# Altium footprint library ThanhNT.PcbLib: 579 footprints (part 4 of 37)
Each footprint in its own frame and in the unit in brackets; x right, y up, seen from the top. Pads: shape width x height; smd on the part's side, far side on the other; paste and mask are expansions set on the pad; w line width, h text height; cw(c..) or ccw(c..) is an arc to the next point about the centre after c.
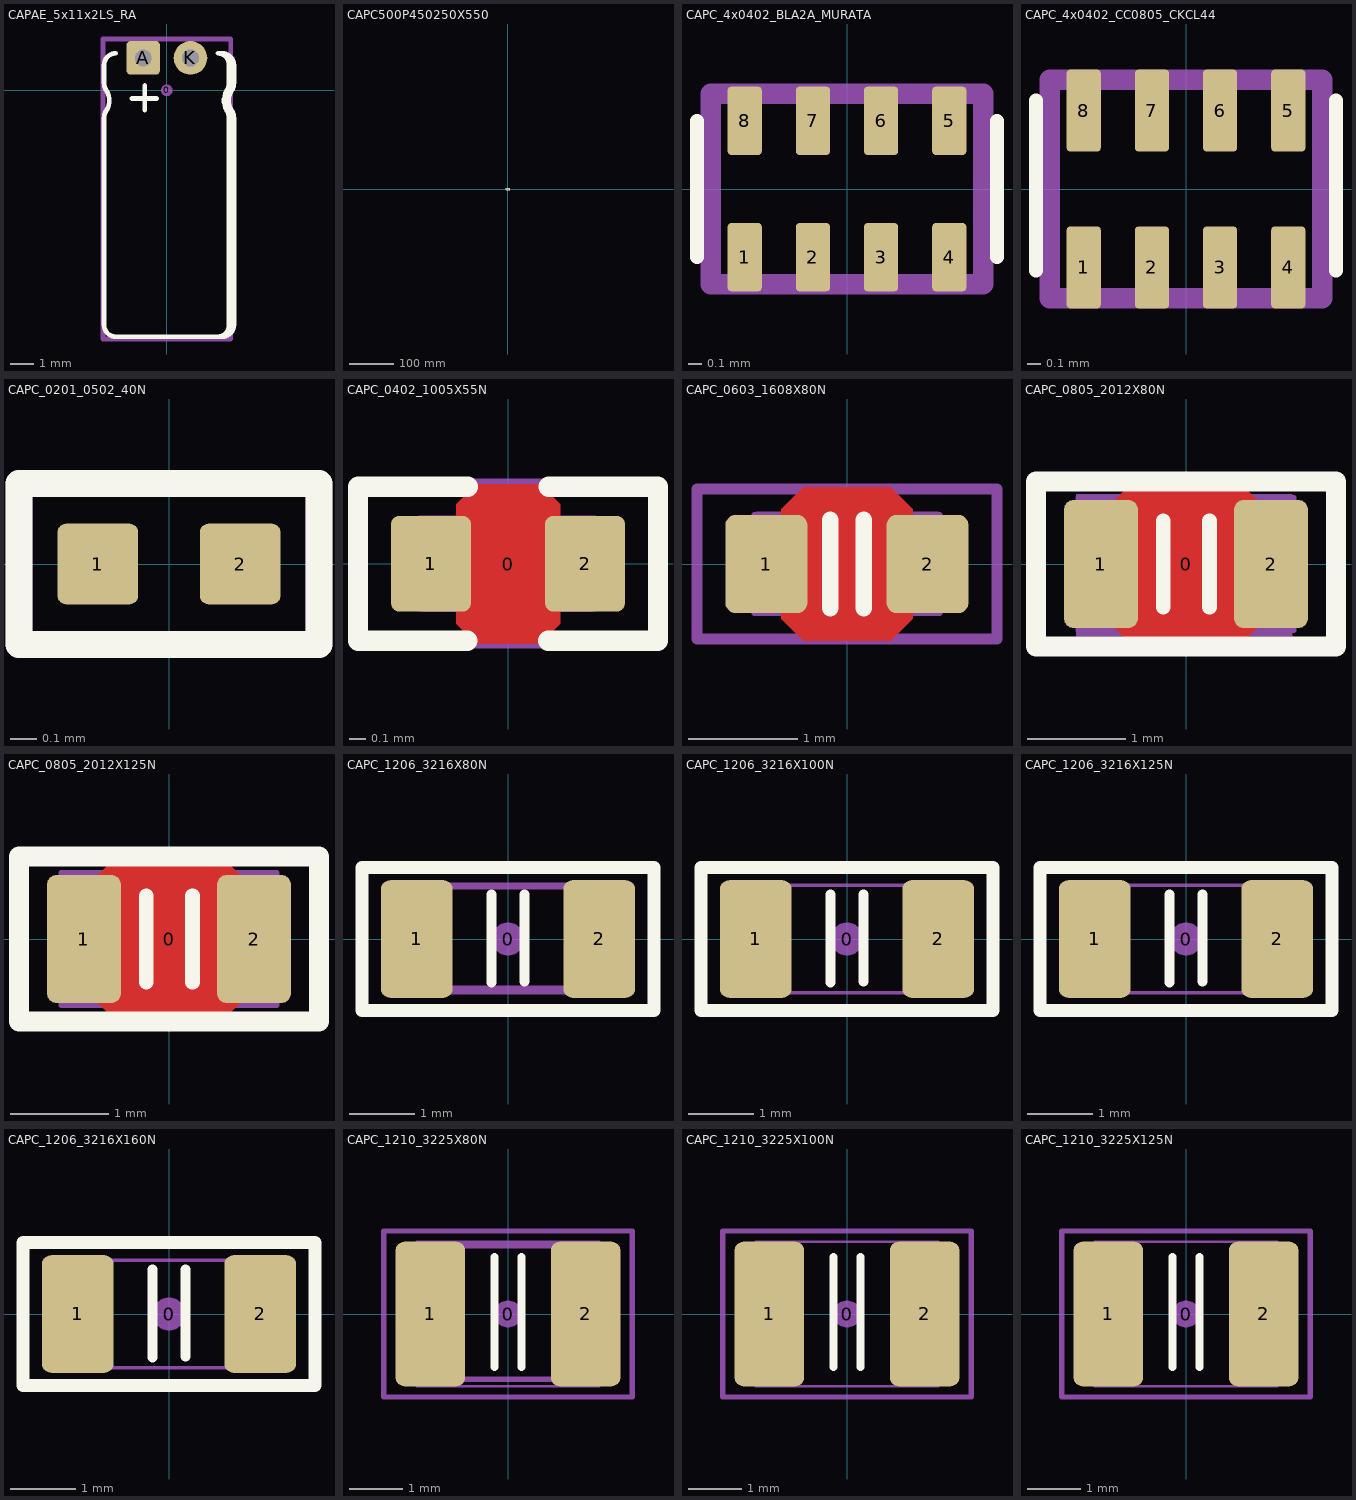
[diagram p3: the footprints below, top view; thin cyan lines are the x and y axes]

## CAPAE_5x11x2LS_RA [mm] "Capacitor, electrolytic, radial can, laid over"
height 5
pads (3):
  round 0.5 on Mech15: 0(0,0)
  rrect25% 1.422x1.422 hole 0.711: A(-1,1.375)
  round 1.422 hole 0.711: K(1,1.375)
Top Overlay:
  lines w0.2: -2.159,1.571 ccw(c-2.159,1.07) -2.66,1.07 -2.66,0.299 ccw(c-2.159,0.299) -2.571,0.013 cw(c-3.209,-0.43) -2.571,-0.872 ccw(c-2.159,-1.158) -2.66,-1.158 -2.66,-9.93 ccw(c-2.159,-9.93) -2.159,-10.431 2.17,-10.431 ccw(c2.15,-9.948) 2.633,-9.93 2.633,-1.158 ccw(c2.103,-1.156) 2.55,-0.872 cw(c3.249,-0.43) 2.55,0.013 ccw(c2.103,0.297) 2.633,0.299 2.633,1.07 ccw(c2.15,1.089) 2.17,1.571 ; -1.485,-0.346 -0.435,-0.346 ; -0.935,-0.846 -0.935,0.204 ; 2.199,-10.43 2.341,-10.43 ccw(c2.341,-9.93) 2.841,-9.93 2.841,-1.158 ccw(c2.341,-1.158) 2.752,-0.873 cw(c3.391,-0.43) 2.752,0.014 ccw(c2.341,0.299) 2.841,0.299 2.841,1.07 ccw(c2.341,1.07) 2.341,1.57 2.199,1.57
Mechanical 15:
  lines w0.2: -2.7,-10.525 2.7,-10.525 2.7,2.175 -2.7,2.175 -2.7,-10.525
3D body "Cap, elec, radial, 5x11x2LS, RA.STEP": height 5.1, standoff -2.2, extent -2.5,-10.322 2.5,1.625

## CAPC500P450250X550 [mm] "TDK FK24 radial ceramic capacitor"
height 5.5
pads (3):
  round 0.508 on Mech15: 0(0,0)
  rrect25% 1.905x1.905 hole 0.8: 1(-2.5,0)
  round 1.905 hole 0.8: 2(2.5,0)
Top Overlay:
  lines w0.2: -3.81,-1.27 -3.81,1.27 3.81,1.27 3.81,-1.27 -3.81,-1.27
Mechanical 13:
  lines w0.127: -2.5,-0.3 cw(c-2.5,0) -2.5,0.3 ; -2.25,-0.523 -2.248,-0.511 -2.24,-0.497 -2.227,-0.48 -2.21,-0.461 -2.186,-0.439 -2.157,-0.415 -2.122,-0.387 -2.083,-0.357 -2.046,-0.327 -2.006,-0.292 -1.995,-0.281 -1.983,-0.268 -1.972,-0.254 -1.962,-0.238 -1.958,-0.229 -1.955,-0.218 -1.954,-0.211 -1.953,-0.203 ; -2.25,0.523 cw(c-3.279,-0.727) -1.953,0.203 ; -2.236,-0.718 cw(c-1.896,-0.22) -2.5,-0.217 -2.5,0.217 cw(c-1.896,0.221) -2.232,0.723 -2.23,0.724 -2.206,0.741 ; -2.232,-0.723 -2.225,-0.727 -2.205,-0.742 ; 2.205,0.742 2.225,0.727 2.232,0.723 ; 2.206,-0.741 2.23,-0.724 2.232,-0.723 ccw(c1.896,-0.221) 2.5,-0.217 2.5,0.217 ccw(c1.896,0.22) 2.236,0.718 ; 2.25,-0.523 2.243,-0.502 2.225,-0.477 2.187,-0.44 2.134,-0.397 2.073,-0.349 2.007,-0.293 1.986,-0.271 1.967,-0.246 1.956,-0.223 1.953,-0.203 ; 2.25,0.523 2.24,0.497 2.21,0.461 2.157,0.415 2.083,0.357 2.046,0.327 2.006,0.292 1.983,0.268 1.962,0.238 1.955,0.218 1.953,0.203 ; 2.5,-0.3 ccw(c2.5,0) 2.5,0.3 ; -1.953,-0.203 1.953,-0.203 ; -1.953,-0.203 -1.953,0.203 ; -1.953,0.203 1.953,0.203 ; -1.8,-1.003 cw(c-1.777,-0.913) -1.867,-0.935 cw(c9.111,-1.292) -1.819,-0.203 -1.819,0.203 ccw(c-168.083,-10.401) -1.867,0.935 cw(c-1.777,0.912) -1.8,1.003 ; -1.8,-1.003 cw(c-1.8,-0.553) -2.25,-0.553 -2.25,0.553 cw(c-1.8,0.553) -1.8,1.003 ; -1.8,-1.003 1.8,-1.003 ; -1.8,1.003 1.8,1.003 ; 1.8,-1.003 ccw(c1.777,-0.912) 1.867,-0.935 cw(c168.269,10.414) 1.819,-0.203 1.819,0.203 ccw(c-9.111,1.292) 1.867,0.935 ccw(c1.777,0.913) 1.8,1.003 ; 1.8,-1.003 ccw(c1.8,-0.553) 2.25,-0.553 2.25,0.553 ccw(c1.8,0.553) 1.8,1.003 ; 1.953,-0.203 1.953,0.203
3D body "TDK FK24 ceramic capacitor.STEP": height 5.47, standoff -2.54, extent -2.797,-1.003 2.798,1.003

## CAPC_4x0402_BLA2A_MURATA [mm]
pads (8):
  rrect20% 0.25x0.5 smd mask+0.025: 1(-0.75,-0.5) 2(-0.25,-0.5) 3(0.25,-0.5) 4(0.75,-0.5) 5(0.75,0.5) 6(0.25,0.5) 7(-0.25,0.5) 8(-0.75,0.5)
Top Overlay:
  lines w0.1: -1.1,-0.5 -1.1,0.5 ; 1.1,-0.5 1.1,0.5
Mechanical 16:
  lines w0.15: -1,-0.7 1,-0.7 1,0.7 -1,0.7 -1,-0.7
3D body: height 0.5, standoff 0, extent -1,-0.5 1,0.5

## CAPC_4x0402_CC0805_CKCL44 [mm]
pads (8):
  rrect20% 0.25x0.6 smd mask+0.025: 1(-0.75,-0.575) 2(-0.25,-0.575) 3(0.25,-0.575) 4(0.75,-0.575) 5(0.75,0.575) 6(0.25,0.575) 7(-0.25,0.575) 8(-0.75,0.575)
Top Overlay:
  lines w0.1: -1.1,-0.6 -1.1,0.65 ; 1.1,-0.6 1.1,0.65
Mechanical 16:
  lines w0.15: -1,-0.8 1,-0.8 1,0.8 -1,0.8 -1,-0.8
3D body: height 1, standoff 0, extent -1,-0.7 1,0.7

## CAPC_0201_0502_40N [mm]
pads (2):
  rrect20% 0.3x0.3 smd mask+0.04: 1(-0.265,0) 2(0.265,0)
Top Overlay:
  lines w0.1: -0.559,-0.3 0.559,-0.3 0.559,0.3 -0.559,0.3 -0.559,-0.3
Mechanical 16:
  lines w0.1: -0.559,-0.3 0.559,-0.3 0.559,0.3 -0.559,0.3 -0.559,-0.3
3D body "C0201.step": height 0.3, standoff 0, extent -0.3,-0.15 0.3,0.15

## CAPC_0402_1005X55N [mm] "Chip Capacitor, Body 1.0x0.5mm, EIA 0402, IPC Medium Density"
height 0.55
pads (3):
  round 0.2 on Mech15: 0(0.001,-0.002)
  rrect20% 0.5x0.6 smd: 1(-0.483,0) 2(0.483,0)
Top Layer:
  pour cut-out: -0.324,0.373 -0.199,0.498 0.201,0.498 0.326,0.373 0.326,-0.377 0.201,-0.502 -0.199,-0.502 -0.324,-0.377
Top Overlay:
  lines w0.127: -0.254,-0.483 -0.94,-0.483 -0.94,0.483 -0.25,0.483 ; 0.25,-0.483 0.94,-0.483 0.94,0.483 0.254,0.483
Mechanical 13:
  lines w0.05: -0.324,-0.257 0.326,-0.257 ; -0.324,0.253 0.326,0.253 ; -0.524,-0.277 -0.324,-0.277 -0.324,0.273 -0.524,0.273 -0.524,-0.277 ; 0.326,-0.277 0.326,0.273 0.526,0.273 0.526,-0.277 0.326,-0.277
Mechanical 15:
  lines w0.1: -0.94,-0.483 -0.94,0.483 0.94,0.483 0.94,-0.483 -0.94,-0.483
Mechanical 16:
  rectangle: -0.56,-0.299 -0.26,0.301
  rectangle: 0.253,-0.299 0.553,0.301
  lines w0.152: -0.251,-0.218 0.239,-0.218 ; -0.251,0.23 0.239,0.23
3D body "User Library-SMD CAPACITOR0402.STEP": height 0.5, standoff 0, extent -0.499,-0.252 0.501,0.248

## CAPC_0603_1608X80N [mm] "Chip Capacitor, Body 1.6x0.8mm, EIA 0603, IPC Medium Density"
height 0.8
pads (2):
  rrect25% 0.75x0.9 smd: 1(-0.737,0) 2(0.737,0)
Top Layer:
  pour cut-out: -0.6,0.5 -0.4,0.7 0.4,0.7 0.6,0.5 0.6,-0.5 0.4,-0.7 -0.4,-0.7 -0.6,-0.5
Top Overlay:
  lines w0.15: -0.152,-0.406 -0.152,0.406 ; 0.152,-0.406 0.152,0.406
Mechanical 13:
  lines w0.05: -0.55,-0.43 0.55,-0.43 ; -0.55,0.43 0.55,0.43 ; -0.85,-0.45 -0.85,0.45 -0.55,0.45 -0.55,-0.45 -0.85,-0.45 ; 0.55,-0.45 0.55,0.45 0.85,0.45 0.85,-0.45 0.55,-0.45
Mechanical 15:
  lines w0.1: -1.372,-0.686 -1.372,0.686 1.372,0.686 1.372,-0.686 -1.372,-0.686
Mechanical 16:
  rectangle: 0.336,-0.472 0.836,0.478
  rectangle: -0.832,-0.472 -0.332,0.478
  lines w0.102: -0.35,-0.421 0.362,-0.421 ; -0.35,0.43 0.362,0.43
3D body "C0603-0.80.step": height 0.81, standoff 0, extent -0.8,-0.41 0.8,0.41

## CAPC_0805_2012X80N [mm] "Chip Capacitor, Body 2.0x1.2mm, EIA 0805, IPC Medium Density"
height 0.8
pads (3):
  round 0.254 on Mech15: 0(0,0)
  rrect25% 0.75x1.3 smd: 1(-0.864,0) 2(0.864,0)
Top Layer:
  pour cut-out: -0.725,0.65 -0.525,0.85 0.525,0.85 0.725,0.65 0.725,-0.65 0.525,-0.85 -0.525,-0.85 -0.725,-0.65
Top Overlay:
  lines w0.15: -0.23,-0.44 -0.23,0.44 ; 0.24,-0.44 0.24,0.44
  lines w0.2: -1.524,-0.838 -1.524,0.838 1.524,0.838 1.524,-0.838 -1.524,-0.838
Mechanical 13:
  lines w0.05: 0.6,-0.674 -0.6,-0.674 ; -0.6,-0.675 -0.6,0.675 -1.1,0.675 -1.1,-0.675 -0.6,-0.675 ; -0.6,-0.674 0.6,-0.674 ; 0.6,-0.675 0.6,0.675 ; 0.6,-0.675 1.1,-0.675 1.1,0.675 0.6,0.675 ; 0.6,0.674 -0.6,0.674 0.6,0.674
Mechanical 15:
  lines w0.1: -1.524,-0.85 1.524,-0.85 1.524,0.85 -1.524,0.85 -1.524,-0.85
Mechanical 16:
  rectangle: -1.116,-0.739 -0.366,0.711
  rectangle: 0.332,-0.739 1.082,0.711
  lines w0.102: -0.405,0.645 0.357,0.645 ; -0.38,-0.675 0.357,-0.675
3D body "C0805-0.80.step": height 0.81, standoff 0, extent -0.9,-0.635 0.9,0.635

## CAPC_0805_2012X125N [mm] "Chip Capacitor, Body 2.0x1.2mm, EIA 0805, IPC Medium Density"
height 1.25
pads (3):
  round 0.254 on Mech15: 0(0,0)
  rrect25% 0.75x1.3 smd: 1(-0.864,0) 2(0.864,0)
Top Layer:
  pour cut-out: -0.725,0.65 -0.525,0.85 0.525,0.85 0.725,0.65 0.725,-0.65 0.525,-0.85 -0.525,-0.85 -0.725,-0.65
Top Overlay:
  lines w0.15: -0.23,-0.44 -0.23,0.44 ; 0.24,-0.44 0.24,0.44
  lines w0.2: -1.524,-0.838 1.524,-0.838 1.524,0.838 -1.524,0.838 -1.524,-0.838
Mechanical 13:
  lines w0.05: 0.6,-0.674 -0.6,-0.674 ; -0.6,-0.675 -0.6,0.675 -1.1,0.675 -1.1,-0.675 -0.6,-0.675 ; -0.6,-0.674 0.6,-0.674 ; 0.6,-0.675 0.6,0.675 ; 0.6,-0.675 1.1,-0.675 1.1,0.675 0.6,0.675 ; 0.6,0.674 -0.6,0.674 0.6,0.674
Mechanical 15:
  lines w0.1: -1.524,-0.85 -1.524,0.85 1.524,0.85 1.524,-0.85 -1.524,-0.85
3D body "C0805-1.25.step": height 1.26, standoff -0.01, extent -0.9,-0.635 0.9,0.635

## CAPC_1206_3216X80N [mm] "Chip Capacitor, Body 3.2x1.6mm, 0.8mm H, EIA 1206, IPC Medium Density"
height 0.8
pads (3):
  round 0.508 on Mech15: 0(0,0)
  rrect25% 1.1x1.8 smd: 1(-1.397,0) 2(1.397,0)
Top Overlay:
  lines w0.15: -0.254,-0.664 -0.254,0.686 ; 0.254,-0.654 0.254,0.686
  lines w0.2: -2.235,-1.092 2.235,-1.092 2.235,1.092 -2.235,1.092 -2.235,-1.092
Mechanical 13:
  lines w0.05: 1.025,-0.824 -1.025,-0.824 1.025,-0.824 ; -1.625,-0.825 -1.625,0.825 -1.025,0.825 -1.025,-0.825 -1.625,-0.825 ; -1.025,0.824 1.025,0.824 -1.025,0.824 ; 1.025,-0.825 1.625,-0.825 1.625,0.825 1.025,0.825 1.025,-0.825
Mechanical 15:
  lines w0.1: -2.235,-1.1 2.235,-1.1 2.235,1.1 -2.235,1.1 -2.235,-1.1
Mechanical 16:
  rectangle: -1.723,-0.826 -0.973,0.874
  rectangle: 0.931,-0.824 1.681,0.876
  lines w0.102: -0.986,-0.762 0.944,-0.762 ; -0.986,0.812 0.944,0.812
3D body "C1206-0.80.step": height 0.81, standoff 0, extent -1.6,-0.81 1.6,0.81

## CAPC_1206_3216X100N [mm] "Chip Capacitor, Body 3.2x1.6mm, 1.0mm H, EIA 1206, IPC Medium Density"
height 1
pads (3):
  round 0.508 on Mech15: 0(0,0)
  rrect25% 1.1x1.8 smd: 1(-1.397,0) 2(1.397,0)
Top Overlay:
  lines w0.15: -0.254,-0.664 -0.254,0.686 ; 0.254,-0.654 0.254,0.686
  lines w0.2: -2.235,-1.092 -2.235,1.092 2.235,1.092 2.235,-1.092 -2.235,-1.092
Mechanical 13:
  lines w0.05: 1.025,-0.824 -1.025,-0.824 1.025,-0.824 ; -1.625,-0.825 -1.025,-0.825 -1.025,0.825 -1.625,0.825 -1.625,-0.825 ; -1.025,0.824 1.025,0.824 -1.025,0.824 ; 1.025,-0.825 1.025,0.825 1.625,0.825 1.625,-0.825 1.025,-0.825
Mechanical 15:
  lines w0.1: -2.235,-1.1 -2.235,1.1 2.235,1.1 2.235,-1.1 -2.235,-1.1
3D body "C1206-1.00.step": height 1.01, standoff 0, extent -1.6,-0.81 1.6,0.81

## CAPC_1206_3216X125N [mm] "Chip Capacitor, Body 3.2x1.6mm, 1.25mm H, EIA 1206, IPC Medium Density"
height 1.25
pads (3):
  round 0.508 on Mech15: 0(0,0)
  rrect25% 1.1x1.8 smd: 1(-1.397,0) 2(1.397,0)
Top Overlay:
  lines w0.15: -0.254,-0.664 -0.254,0.686 ; 0.254,-0.654 0.254,0.686
  lines w0.2: -2.235,-1.092 2.235,-1.092 2.235,1.092 -2.235,1.092 -2.235,-1.092
Mechanical 13:
  lines w0.05: 1.025,-0.824 -1.025,-0.824 1.025,-0.824 ; -1.625,-0.825 -1.025,-0.825 -1.025,0.825 -1.625,0.825 -1.625,-0.825 ; -1.025,0.824 1.025,0.824 -1.025,0.824 ; 1.025,-0.825 1.025,0.825 1.625,0.825 1.625,-0.825 1.025,-0.825
Mechanical 15:
  lines w0.1: -2.235,-1.1 2.235,-1.1 2.235,1.1 -2.235,1.1 -2.235,-1.1
3D body "C1206-1.25.step": height 1.26, standoff -0.01, extent -1.6,-0.81 1.6,0.81

## CAPC_1206_3216X160N [mm] "Chip Capacitor, Body 3.2x1.6mm, 1.6mm H, EIA 1206, IPC Medium Density"
height 1.6
pads (3):
  round 0.508 on Mech15: 0(0,0)
  rrect25% 1.1x1.8 smd: 1(-1.397,0) 2(1.397,0)
Top Overlay:
  lines w0.15: -0.254,-0.664 -0.254,0.686 ; 0.254,-0.654 0.254,0.686
  lines w0.2: -2.235,-1.092 -2.235,1.092 2.235,1.092 2.235,-1.092 -2.235,-1.092
Mechanical 13:
  lines w0.05: 1.025,-0.824 -1.025,-0.824 1.025,-0.824 ; -1.625,-0.825 -1.025,-0.825 -1.025,0.825 -1.625,0.825 -1.625,-0.825 ; -1.025,0.824 1.025,0.824 -1.025,0.824 ; 1.025,-0.825 1.025,0.825 1.625,0.825 1.625,-0.825 1.025,-0.825
Mechanical 15:
  lines w0.1: -2.235,-1.1 -2.235,1.1 2.235,1.1 2.235,-1.1 -2.235,-1.1
3D body "C1206-1.60.step": height 1.62, standoff -0.01, extent -1.6,-0.81 1.6,0.81

## CAPC_1210_3225X80N [mm] "Chip Capacitor, Body 3.2x2.5mm, EIA 1210, IPC Medium Density"
height 0.8
pads (3):
  round 0.508 on Mech15: 0(0,0)
  rrect25% 1.3x2.7 smd: 1(-1.45,0) 2(1.45,0)
Top Overlay:
  lines w0.15: -0.254,-0.991 -0.254,1.067 ; 0.254,-0.991 0.254,1.067
Mechanical 13:
  lines w0.05: -1.7,-1.35 -1.7,1.35 -1.1,1.35 -1.1,-1.35 -1.7,-1.35 ; -1.1,-1.349 1.1,-1.349 -1.1,-1.349 ; -1.1,1.349 1.1,1.349 -1.1,1.349 ; 1.1,-1.35 1.7,-1.35 1.7,1.35 1.1,1.35 1.1,-1.35
Mechanical 15:
  lines w0.1: -2.32,-1.55 2.32,-1.55 2.32,1.55 -2.32,1.55 -2.32,-1.55
Mechanical 16:
  rectangle: 0.949,-1.275 1.699,1.325
  rectangle: -1.705,-1.265 -0.955,1.335
  lines w0.102: -0.968,-1.215 0.962,-1.215 ; -0.968,1.275 0.962,1.275
3D body "C1210-0.80.step": height 0.81, standoff 0, extent -1.6,-1.26 1.6,1.26

## CAPC_1210_3225X100N [mm] "Chip Capacitor, Body 3.2x2.5mm, EIA 1210, IPC Medium Density"
height 1
pads (3):
  round 0.508 on Mech15: 0(0,0)
  rrect25% 1.3x2.7 smd: 1(-1.45,0) 2(1.45,0)
Top Overlay:
  lines w0.15: -0.254,-0.991 -0.254,1.067 ; 0.254,-0.991 0.254,1.067
Mechanical 13:
  lines w0.05: -1.7,-1.35 -1.1,-1.35 -1.1,1.35 -1.7,1.35 -1.7,-1.35 ; -1.1,-1.349 1.1,-1.349 -1.1,-1.349 ; -1.1,1.349 1.1,1.349 -1.1,1.349 ; 1.1,-1.35 1.1,1.35 1.7,1.35 1.7,-1.35 1.1,-1.35
Mechanical 15:
  lines w0.1: -2.32,-1.55 -2.32,1.55 2.32,1.55 2.32,-1.55 -2.32,-1.55
3D body "C1210-1.00.step": height 1.01, standoff 0, extent -1.6,-1.26 1.6,1.26

## CAPC_1210_3225X125N [mm] "Chip Capacitor, Body 3.2x2.5mm, EIA 1210, IPC Medium Density"
height 1.25
pads (3):
  round 0.508 on Mech15: 0(0,0)
  rrect25% 1.3x2.7 smd: 1(-1.45,0) 2(1.45,0)
Top Overlay:
  lines w0.15: -0.254,-0.991 -0.254,1.067 ; 0.254,-0.991 0.254,1.067
Mechanical 13:
  lines w0.05: -1.7,-1.35 -1.7,1.35 -1.1,1.35 -1.1,-1.35 -1.7,-1.35 ; -1.1,-1.349 1.1,-1.349 -1.1,-1.349 ; -1.1,1.349 1.1,1.349 -1.1,1.349 ; 1.1,-1.35 1.7,-1.35 1.7,1.35 1.1,1.35 1.1,-1.35
Mechanical 15:
  lines w0.1: -2.32,-1.55 2.32,-1.55 2.32,1.55 -2.32,1.55 -2.32,-1.55
3D body "C1210-1.25.step": height 1.26, standoff -0.01, extent -1.6,-1.26 1.6,1.26